# Altium footprint library Amirreza.PcbLib: 524 footprints (part 23 of 33)
Each footprint in its own frame and in the unit in brackets; x right, y up, seen from the top. Pads: shape width x height; smd on the part's side, far side on the other; paste and mask are expansions set on the pad; w line width, h text height; cw(c..) or ccw(c..) is an arc to the next point about the centre after c.
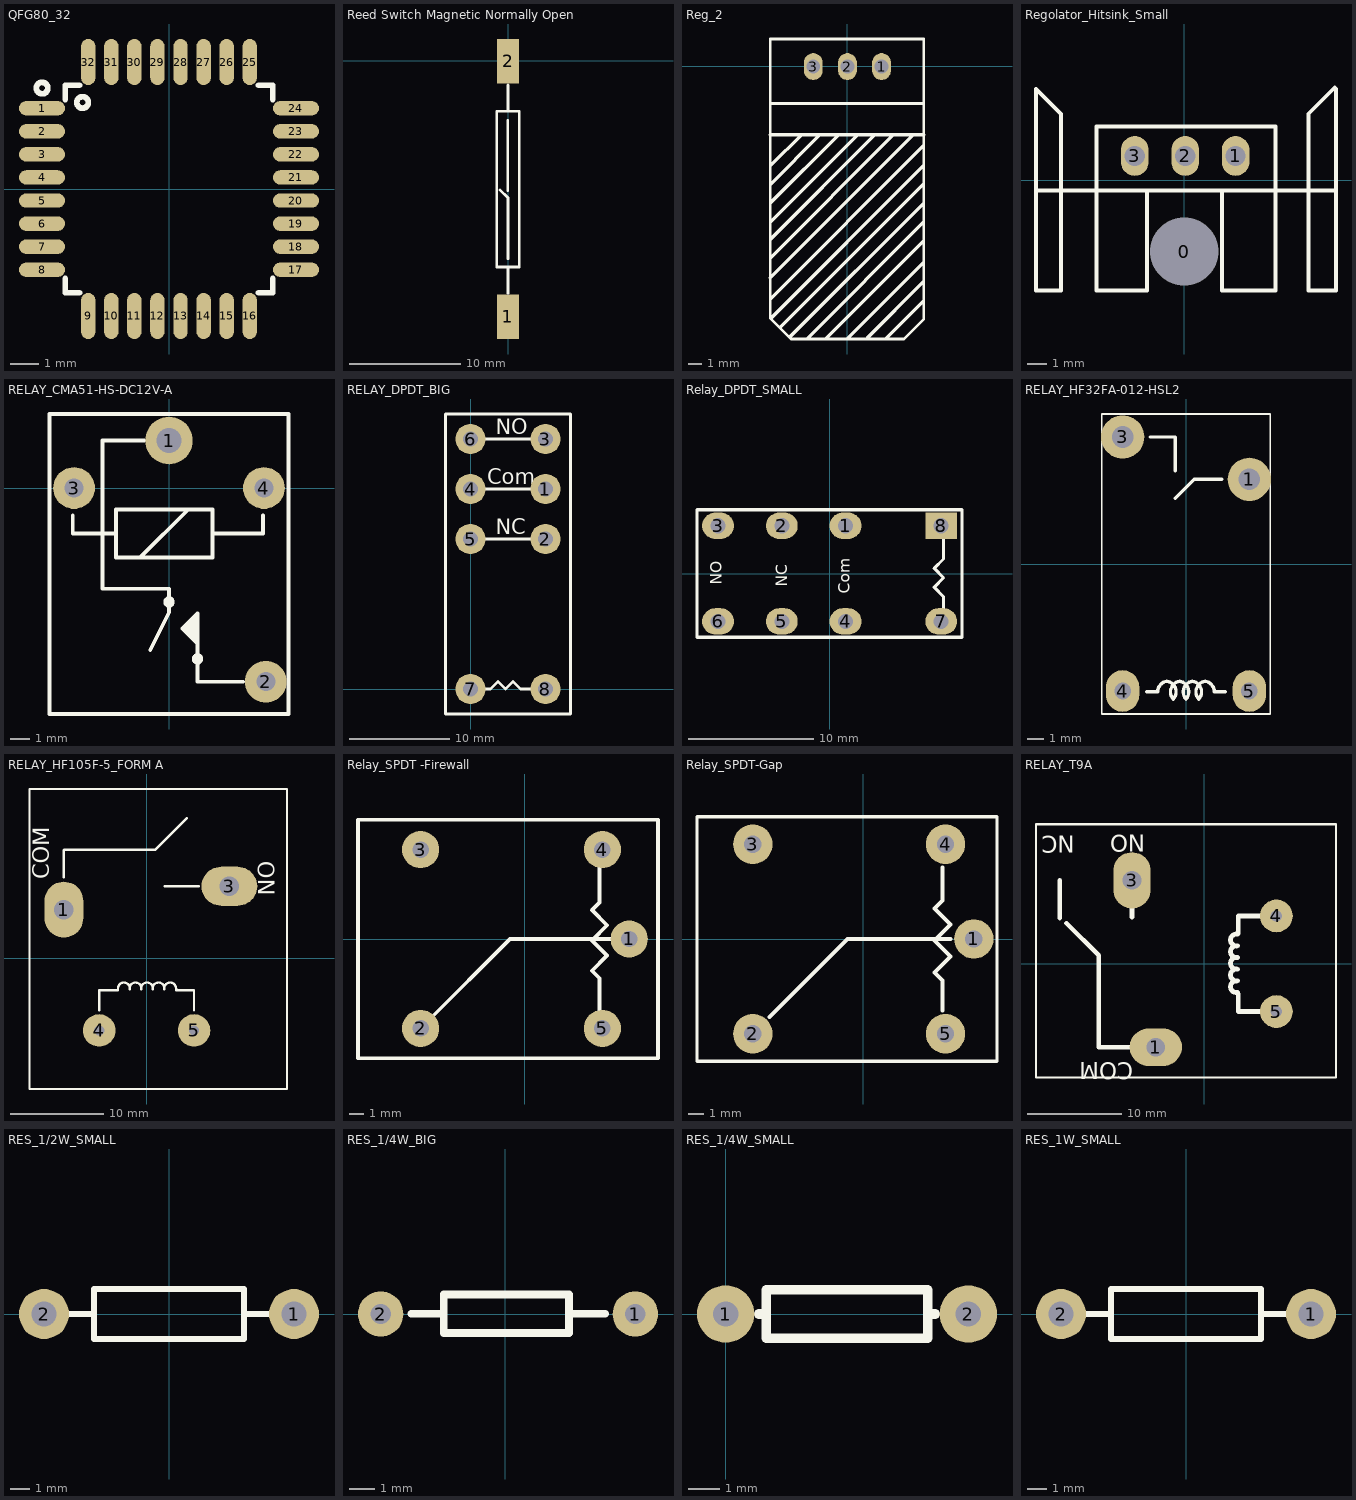
[diagram p22: the footprints below, top view; thin cyan lines are the x and y axes]

## QFG80_32 [mm] "TQFP32, A32 (Cypress), GP32 (Zarlink), MS-026ABA(JEDEC), 7X7mm, 0.8mm"
pads (32):
  oval 1.6x0.5 smd: 1(-4.4,2.8) 2(-4.4,2) 3(-4.4,1.2) 4(-4.4,0.4) 5(-4.4,-0.4) 6(-4.4,-1.2) 7(-4.4,-2) 8(-4.4,-2.8) 17(4.4,-2.8) 18(4.4,-2) 19(4.4,-1.2) 20(4.4,-0.4) 21(4.4,0.4) 22(4.4,1.2) 23(4.4,2) 24(4.4,2.8)
  oval 0.5x1.6 smd: 9(-2.8,-4.4) 10(-2,-4.4) 11(-1.2,-4.4) 12(-0.4,-4.4) 13(0.4,-4.4) 14(1.2,-4.4) 15(2,-4.4) 16(2.8,-4.4) 25(2.8,4.4) 26(2,4.4) 27(1.2,4.4) 28(0.4,4.4) 29(-0.4,4.4) 30(-1.2,4.4) 31(-2,4.4) 32(-2.8,4.4)
Top Overlay:
  circle w0.2: c-4.4,3.5 r0.2
  circle w0.2: c-3,3 r0.2
  lines w0.2: -3.6,-3.1 -3.6,-3.6 -3.1,-3.6 ; -3.6,3.1 -3.6,3.6 -3.1,3.6 ; 3.1,-3.6 3.6,-3.6 3.6,-3.1 ; 3.1,3.6 3.6,3.6 3.6,3.1
3D body "User Library-LQFP32.STEP": height 1.63, standoff -0.09, extent -4.5,-4.5 4.5,4.5

## Reed Switch Magnetic Normally Open [mm]
pads (2):
  rect 2x4 smd: 1(-0.026,-22.987) 2(-0.025,-0.025)
Top Overlay:
  lines w0.254: -0.737,-11.582 -0.025,-12.294 -0.025,-17.78 ; -0.051,-11.659 -0.051,-5.359 ; -0.025,-20.879 -0.025,-18.567 ; -0.025,-4.521 -0.025,-2.159 ; -1.041,-18.517 -1.041,-4.521 0.991,-4.521 0.991,-18.517 -1.041,-18.517

## Reg_2 [mm]
pads (3):
  oval 1.4x2 hole 1.016: 1(2.547,-0.019) 2(0.007,-0.019) 3(-2.533,-0.019)
Top Overlay:
  lines w0.2: -5.74,-2.771 5.69,-2.771 ; -5.74,-18.745 -5.74,2.032 5.69,2.032 5.69,-18.821 4.216,-20.295 -4.191,-20.295 -5.74,-18.745
  lines w0.254: -5.74,-5.08 5.69,-5.08 ; -5.728,-15.735 4.915,-5.093 ; -5.715,-12.852 2.032,-5.105 ; -5.715,-11.557 0.762,-5.08 ; -5.715,-8.763 -2.045,-5.093 ; -5.702,-17.285 5.664,-5.918 ; -5.702,-14.237 3.429,-5.105 ; -5.69,-10.135 -0.648,-5.093 ; -5.664,-7.341 -3.404,-5.08 ; -5.639,-18.694 5.651,-7.404 ; -4.978,-19.431 5.626,-8.826 ; -4.267,-20.142 5.651,-10.223 ; -2.997,-20.269 5.651,-11.62 ; -1.6,-20.269 5.651,-13.018 ; 0.025,-20.244 5.664,-14.605 ; 1.473,-20.218 5.664,-16.027 ; 2.845,-20.269 5.639,-17.475

## Regolator_Hitsink_Small [mm]
pads (4):
  oval 1.4x2 hole 3.429: 0(0.002,-3.578)
  oval 1.4x2 hole 1.016: 1(2.592,1.236) 2(0.052,1.236) 3(-2.488,1.236)
Top Overlay:
  lines w0.2: -7.466,-0.5 7.647,-0.5 ; -1.895,-5.54 -4.418,-5.54 -4.418,2.715 4.599,2.715 4.599,-5.54 1.915,-5.54 1.915,-0.5 ; -1.878,-5.54 -1.878,-0.5 ; -7.466,-5.54 -7.466,4.62 -6.196,3.35 -6.196,0.937 -6.196,-5.54 -7.466,-5.54 ; 6.25,-5.54 7.647,-5.54 7.647,4.62 7.584,4.684 6.25,3.35 6.25,-0.5 6.25,-5.54

## RELAY_CMA51-HS-DC12V-A [mm] "RELAY, SPDT, 15.40x12.10x14.0mm, G8QN, SUN HOLD RAM"
height 13.1
pads (4):
  round 2.5 hole 1.3: 1(0,2.5)
  round 2.2 hole 1: 2(5.1,-10.2) 3(-5,0) 4(5,0)
Top Overlay:
  circle w0.2: c0,-6 r0.2
  circle w0.2: c1.5,-9 r0.2
  region: 1.5,-6.6 1.5,-8.2 0.7,-7.4
  lines w0.2: -5.073,-1.45 -5.073,-2.392 -2.794,-2.392 ; -1.524,-3.662 1.016,-1.122 ; -1.3,2.5 -3.5,2.5 -3.5,-5.3 0,-5.3 0,-6.5 ; -0.989,-8.532 0.011,-6.532 ; 1.5,-8.2 0.7,-7.4 1.5,-6.6 1.5,-10.2 3.9,-10.2 ; 4.948,-1.45 4.948,-2.392 2.286,-2.392 ; 2.286,-2.392 2.286,-1.122 -2.794,-1.122 -2.794,-3.662 2.286,-3.662 2.286,-2.392 ; -6.3,-11.9 -6.3,3.9 6.3,3.9 6.3,-11.9 -6.3,-11.9
3D body "User Library-G8QN-05-EX.step": height 14, standoff -3.4, extent -6,-11.8 6,3.7

## RELAY_DPDT_BIG [mil]
pads (8):
  round 120 hole 59.05: 1(295.27,788.4) 2(295.27,591.55) 4(0,788.4) 5(0,591.55)
  round 120 hole 59.06: 3(295.27,985.25) 6(0,985.25) 7(0,1) 8(295.27,1)
Top Overlay:
  lines w10: -0.36,15.27 13.91,1 78.74,1 108.27,30.53 137.8,1 167.32,30.53 196.85,1 295.28,1 ; 0,591.55 295.27,591.55 ; 0,985.25 295.27,985.25 ; 78.74,788.4 0,788.4 295.27,788.4 ; -98.43,-97.43 -98.43,514.59 -98.43,623.25 -98.43,1083.68 393.7,1083.68 393.7,-97.43 -98.43,-97.43
  text "Com" at 65.48,808.09 h60
  text "NC" at 98.43,611.24 h60
  text "NO" at 98.43,1004.94 h60

## Relay_DPDT_SMALL [mm]
pads (8):
  oval 2.54x2.1 hole 1.2: 1(1.27,3.81) 2(-3.81,3.81) 3(-8.89,3.81) 4(1.27,-3.81) 5(-3.81,-3.81) 6(-8.89,-3.81) 7(8.89,-3.81)
  rect 2.54x2.1 hole 1.2: 8(8.89,3.81)
Top Overlay:
  lines w0.254: 9.071,-3.489 9.071,-1.842 8.321,-1.092 9.071,-0.342 8.321,0.408 9.071,1.158 9.071,3.658 ; -10.566,-5.08 -10.566,5.08 10.541,5.08 10.541,-5.08 -10.566,-5.08
  text "Com" at 1.905,-1.626 h1.52
  text "NC" at -3.048,-1.041 h1.52
  text "NO" at -8.28,-0.889 h1.52
3D body "User Library-CRST19F RELAY.step": height 12.1, standoff -5, extent -10.5,-5 10.5,5

## RELAY_HF32FA-012-HSL2 [mm]
pads (4):
  round 2.6 hole 1.3: 1(3.8,5.08) 3(-3.8,7.62)
  oval 2x2.5 hole 1: 4(-3.8,-7.62) 5(3.8,-7.62)
Top Overlay:
  lines w0.1: -5.05,-9 -5.05,9 5.05,9 5.05,-9 -5.05,-9
  lines w0.203: -2.361,-7.671 -1.695,-7.671 cw(c-1.044,-7.671) -1.147,-7.028 cw(c-1.249,-7.671) -0.764,-8.104 cw(c-0.279,-7.671) -0.382,-7.028 cw(c-0.484,-7.671) 0,-8.104 cw(c0.485,-7.671) 0.383,-7.028 cw(c0.28,-7.671) 0.765,-8.104 cw(c1.25,-7.671) 1.148,-7.028 cw(c1.045,-7.671) 1.695,-7.671 2.362,-7.671 ; -2.149,7.62 -0.645,7.62 -0.645,5.588 ; -0.645,3.937 0.498,5.08 0.625,5.08 2.149,5.08
3D body "RELAY_4_PIN__HONGFA_BLACK.STEP": height 15.05, standoff -2.25, extent -5,-9 5,9

## RELAY_HF105F-5_FORM A [mm]
pads (4):
  oval 4.2x6 hole 2.1: 1(-8.9,5.25)
  oval 6x4.2 hole 2.1: 3(8.9,7.75)
  round 3.5 hole 1.1: 4(-5.1,-7.75) 5(5.1,-7.75)
Top Overlay:
  lines w0.254: -8.9,8.735 -8.9,11.646 -8.88,11.666 0.899,11.666 4.328,15.095 ; -5.105,-5.607 -5.105,-3.419 -3.073,-3.419 ; -3.073,-3.353 cw(c-2.45,-3.229) -1.827,-3.353 cw(c-1.205,-3.229) -0.582,-3.353 cw(c0.041,-3.229) 0.663,-3.353 cw(c1.286,-3.229) 1.909,-3.353 cw(c2.531,-3.229) 3.154,-3.353 ; 1.915,7.75 5.598,7.75 ; 3.154,-3.419 5.095,-3.419 5.095,-5.607 ; -12.6,-14.05 -12.6,18.21 15.1,18.21 15.1,-14.05 -12.6,-14.05
  text "NO" at 14.361,6.713 h3.05
  text "COM" at -9.896,8.51 h3.05
3D body "AZ2100_1C-XXXX_POWER RELAY.SLDPRT": height 27.99, standoff -3.51, extent -12.462,-14.049 14.97,18.209

## Relay_SPDT -Firewall [mm]
pads (5):
  round 2.5 hole 1.1: 1(7,0) 2(-7,-6) 3(-7,6) 4(5.2,6) 5(5.2,-6)
Top Overlay:
  lines w0.254: -6.684,-6.192 -6.684,-5.176 ; -6.684,4.984 -6.684,5.492 ; -6.588,-5.588 -1,0 7,0 ; 5,-6.192 5,-2.636 4.492,-2.128 5.508,-1.112 4.492,-0.096 5.508,0.92 4.492,1.936 5,2.444 5,5.492 ; 8.93,-8 -11.2,-8 -11.2,8 8.93,8 8.93,-7.982

## Relay_SPDT-Gap [mm]
pads (5):
  round 2.5 hole 1.1: 1(7,0) 2(-7,-6) 3(-7,6) 4(5.2,6) 5(5.2,-6)
Top Overlay:
  lines w0.203: -10.536,-7.739 8.461,-7.739 8.461,7.739 -10.536,7.739 -10.536,-7.739
  lines w0.254: -5.941,-4.941 -1,0 5.515,0 ; 5,-4.528 5,-2.636 4.492,-2.128 5.508,-1.112 4.492,-0.096 5.508,0.92 4.492,1.936 5,2.444 5,4.533
3D body "User Library-Tianbo Relay ( HJR-3FF-S-Z).step": height 15.51, standoff -2.2, extent -10.538,-7.761 8.462,7.739

## RELAY_T9A [mm]
pads (4):
  oval 5.588x4 hole 2: 1(-5.16,-8.9)
  oval 4x6 hole 2: 3(-7.7,8.9)
  round 3.5 hole 1.2: 4(7.7,5.1) 5(7.7,-5.1)
Top Overlay:
  lines w0.254: -17.94,-12.131 14.06,-12.131 14.06,14.869 -17.94,14.869 -17.94,-12.131
  lines w0.5: -15.4,4.883 -15.4,8.9 ; -14.685,4.328 -11.256,0.899 -11.256,-8.88 -11.236,-8.9 -5.16,-8.9 ; -7.7,4.963 -7.7,8.9 ; 3.636,-3.195 3.636,-5.1 7.7,-5.1 ; 3.636,3.195 3.636,5.1 7.7,5.1
  lines w0.508: 3.57,-3.068 cw(c3.445,-2.445) 3.57,-1.823 cw(c3.445,-1.2) 3.57,-0.577 cw(c3.445,0.045) 3.57,0.668 cw(c3.445,1.291) 3.57,1.913 cw(c3.445,2.536) 3.57,3.159
  text "COM" at -7.573,-9.896 h3.05
  text "NC" at -13.796,14.234 h3.05
  text "NO" at -6.303,14.361 h3.05
3D body "619747_t9as5d22-12.stp": height 27.94, standoff -3.3, extent -18.186,-12.37 14.326,15.062

## RES_1/2W_SMALL [mm]
pads (2):
  round 2.54 hole 1.27: 1(6.35,0) 2(-6.35,0)
Top Overlay:
  lines w0.305: -5.334,0 -3.81,0 ; 3.81,0 5.334,0 ; -3.81,-1.27 3.81,-1.27 3.81,1.27 -3.81,1.27 -3.81,-1.27
3D body "User Library-Res50-Axial 0_5W-150R.step": height 3.88, standoff -5.5, extent -6.725,-1.875 6.725,1.875

## RES_1/4W_BIG [mm]
pads (2):
  round 1.8 hole 0.8: 1(5.146,0.013) 2(-4.938,0.013)
Top Overlay:
  lines w0.305: -3.734,0.021 -2.563,0.021 ; 3.952,0.021 2.517,0.021 ; 2.517,0.021 2.517,-0.741 -2.438,-0.741 -2.438,0.783 2.517,0.783 2.517,0.021

## RES_1/4W_SMALL [mm]
pads (2):
  round 1.8 hole 0.8: 1(0,0) 2(7.62,0)
Top Overlay:
  lines w0.305: 1.041,0 1.27,0 ; 6.579,0 6.35,0 ; 6.35,0 6.35,-0.762 1.27,-0.762 1.27,0.762 6.35,0.762 6.35,0

## RES_1W_SMALL [mm]
pads (2):
  round 2.54 hole 1.27: 1(6.35,0) 2(-6.35,0)
Top Overlay:
  lines w0.305: -5.334,0 -3.81,0 ; 3.81,0 5.334,0 ; -3.81,-1.27 3.81,-1.27 3.81,1.27 -3.81,1.27 -3.81,-1.27
3D body "User Library-Res50 1W SilCoat.step": height 4.52, standoff -2, extent -6.725,-2.25 6.725,2.25